# Altium footprint library PcbLibWatch.PcbLib: 17 footprints (part 1 of 2)
Each footprint in its own frame and in the unit in brackets; x right, y up, seen from the top. Pads: shape width x height; smd on the part's side, far side on the other; paste and mask are expansions set on the pad; w line width, h text height; cw(c..) or ccw(c..) is an arc to the next point about the centre after c.
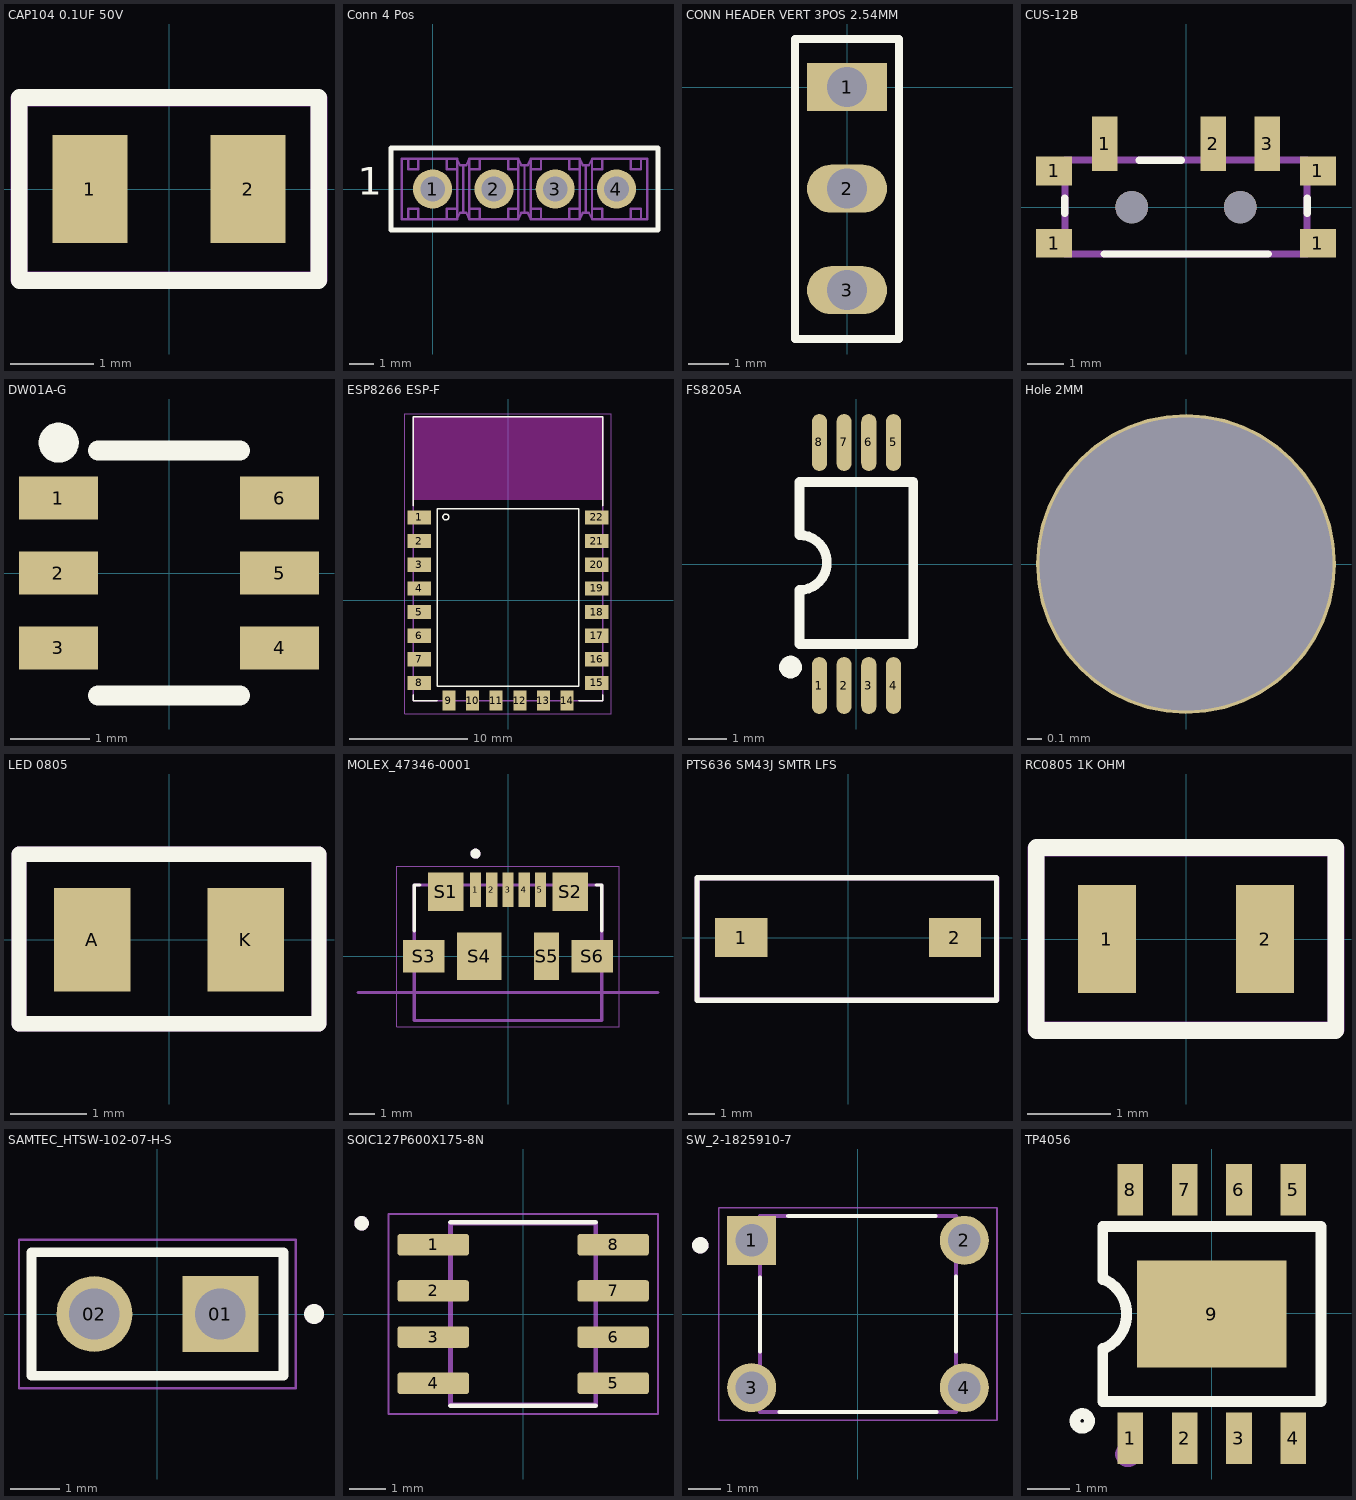
[diagram p0: the footprints below, top view; thin cyan lines are the x and y axes]

## CAP104 0.1UF 50V [mm] "0.1µF ±10% 50V Ceramic Capacitor X7R 0805 (2012 Metric)"
pads (2):
  rect 0.9x1.3 smd: 1(-0.95,0) 2(0.95,0)
Top Overlay:
  lines w0.2: -1.8,-1.1 1.8,-1.1 1.8,1.1 -1.8,1.1 -1.8,-1.1
Mechanical 29:
  lines w0.2: -1.803,-1.092 -1.803,1.092 1.803,1.092 1.803,-1.092 -1.803,-1.092
  text "'.Designator'" at -0.965,-0.813 h0.7
3D body "C0805C104K5RACTU.step": height 0.88, standoff 0, extent -1.1,-0.725 1.1,0.725

## Conn 4 Pos [mm]
pads (4):
  round 1.62 hole 1.02: 1(0,0) 2(2.54,0) 3(5.08,0) 4(7.62,0)
Top Overlay:
  lines w0.2: -1.72,-1.695 9.34,-1.695 9.34,1.695 -1.72,1.695 -1.72,-1.695
  text "1" at -3.09,-0.635 h1.97
Top Solder:
  circle w0: c7.62,0 r0.861
  circle w0: c5.08,0 r0.861
  circle w0: c2.54,0 r0.861
  circle w0: c0,0 r0.861
Bottom Solder:
  circle w0: c7.62,0 r0.861
  circle w0: c5.08,0 r0.861
  circle w0: c2.54,0 r0.861
  circle w0: c0,0 r0.861
Mechanical 16:
  lines w0.1: -1.016,-1.245 -1.016,-0.813 -0.587,-0.813 -0.587,-1.245 ; -1.016,1.245 -1.016,0.813 -0.587,0.813 -0.587,1.245 ; 0.587,-1.245 0.587,-0.813 1.016,-0.813 1.016,-1.245 ; 0.587,1.245 0.587,0.813 1.016,0.813 1.016,1.245 ; 1.953,-1.245 1.953,-0.813 1.524,-0.813 1.524,-1.245 ; 1.953,1.245 1.953,0.813 1.524,0.813 1.524,1.245 ; 3.127,-1.245 3.127,-0.813 3.556,-0.813 3.556,-1.245 ; 3.127,1.245 3.127,0.813 3.556,0.813 3.556,1.245 ; 4.493,-1.245 4.493,-0.813 4.064,-0.813 4.064,-1.245 ; 4.493,1.245 4.493,0.813 4.064,0.813 4.064,1.245 ; 5.667,-1.245 5.667,-0.813 6.096,-0.813 6.096,-1.245 ; 5.667,1.245 5.667,0.813 6.096,0.813 6.096,1.245 ; 7.033,-1.245 7.033,-0.813 6.604,-0.813 6.604,-1.245 ; 7.033,1.245 7.033,0.813 6.604,0.813 6.604,1.245 ; 8.207,-1.245 8.207,-0.813 8.636,-0.813 8.636,-1.245 ; 8.207,1.245 8.207,0.813 8.636,0.813 8.636,1.245 ; 1.016,-1.245 1.14,-0.991 1.27,-0.991 ; 1.016,-1.245 1.016,1.245 ; 1.016,-1.245 -1.27,-1.245 -1.27,1.245 1.016,1.245 ; 1.016,1.245 1.14,0.991 1.27,0.991 ; 1.27,-0.991 1.27,0.991 ; 1.27,-0.991 1.4,-0.991 1.524,-1.245 ; 1.27,-0.991 1.27,0.991 ; 1.27,0.991 1.4,0.991 1.524,1.245 ; 1.524,-1.245 1.524,1.245 ; 1.524,-1.245 3.556,-1.245 ; 1.524,1.245 3.556,1.245 ; 3.556,-1.245 3.556,1.245 ; 3.556,-1.245 3.68,-0.991 3.81,-0.991 ; 3.556,1.245 3.68,0.991 3.81,0.991 ; 3.81,-0.991 3.81,0.991 ; 3.81,-0.991 3.94,-0.991 4.064,-1.245 ; 3.81,-0.991 3.81,0.991 ; 3.81,0.991 3.94,0.991 4.064,1.245 ; 4.064,-1.245 4.064,1.245 ; 4.064,-1.245 6.096,-1.245 ; 4.064,1.245 6.096,1.245 ; 6.096,-1.245 6.096,1.245 ; 6.096,-1.245 6.22,-0.991 6.35,-0.991 ; 6.096,1.245 6.22,0.991 6.35,0.991 ; 6.35,-0.991 6.35,0.991 ; 6.35,-0.991 6.48,-0.991 6.604,-1.245 ; 6.35,-0.991 6.35,0.991 ; 6.35,0.991 6.48,0.991 6.604,1.245 ; 6.604,-1.245 6.604,1.245 ; 6.604,-1.245 8.89,-1.245 8.89,1.245 6.604,1.245 ; -0.318,-0.318 -0.318,0.318 0.318,0.318 0.318,-0.318 -0.318,-0.318 ; 2.222,-0.318 2.858,-0.318 2.858,0.318 2.222,0.318 2.222,-0.318 ; 4.762,-0.318 5.398,-0.318 5.398,0.318 4.762,0.318 4.762,-0.318 ; 7.302,-0.318 7.302,0.318 7.938,0.318 7.938,-0.318 7.302,-0.318
  text "1" at -3.09,-0.635 h1.97
Mechanical 42:
  lines w0.1: -1.72,-1.695 9.34,-1.695 9.34,1.695 -1.72,1.695 -1.72,-1.695
3D body "HTSW-104-07-T-S.stp": height 8.38, standoff -2.54, extent -1.143,-1.27 9.017,1.219

## CONN HEADER VERT 3POS 2.54MM [mm]
pads (3):
  rect 2x1.2 hole 1: 1(0,0)
  oval 2x1.2 hole 1: 2(0,-2.54) 3(0,-5.08)
Top Overlay:
  lines w0.2: -1.3,-6.3 -1.3,1.2 1.3,1.2 1.3,-6.3 -1.3,-6.3
3D body "c-87220-3-k-3d.stp": height 10.58, standoff -2.96, extent -1.168,-6.147 1.168,1.067

## CUS-12B [mm]
pads (9):
  rect 1x0.8 smd: 1(-3.65,-1) 1(-3.65,1) 1(3.65,-1) 1(3.65,1)
  rect 0.7x1.5 smd: 1(-2.25,1.75) 2(0.75,1.75) 3(2.25,1.75)
  round 0.9 hole 0.9 unplated: ""(-1.5,0) ""(1.5,0)
Top Overlay:
  lines w0.2: -3.353,-0.178 -3.353,0.254 ; -2.261,-1.295 2.286,-1.295 ; -1.295,1.295 -0.127,1.295 ; 3.353,-0.178 3.353,0.254
Mechanical 13:
  lines w0.2: -3.35,-1.3 3.35,-1.3 3.35,1.3 -3.35,1.3 -3.35,-1.3
3D body "CUS-12TB.stp": height 1.37, standoff -0.53, extent -3.85,-2.8 3.85,2.2

## DW01A-G [mm] "Bao ve pin lithium"
pads (6):
  rect 1x0.55 smd: 1(-1.4,0.95) 2(-1.4,0) 3(-1.4,-0.95) 4(1.4,-0.95) 5(1.4,0) 6(1.4,0.95)
Top Overlay:
  circle w0.254: c-1.397,1.651 r0.127
  lines w0.254: -0.9,-1.55 0.9,-1.55 ; -0.9,1.55 0.9,1.55
Mechanical 15:
  circle w0.2: c-1.4,0.95 r0.1
3D body "SOT-23-6.step": height 1.09, standoff 0, extent -1.213,-1.397 1.213,1.397

## ESP8266 ESP-F [mm] "ESP8266-12E/ESP-12E"
pads (22):
  rect 2x1.2 smd: 1(-7.5,7) 2(-7.5,5) 3(-7.5,3) 4(-7.5,1) 5(-7.5,-1) 6(-7.5,-3) 7(-7.5,-5) 8(-7.5,-7) 15(7.5,-7) 16(7.5,-5) 17(7.5,-3) 18(7.5,-1) 19(7.5,1) 20(7.5,3) 21(7.5,5) 22(7.5,7)
  rect 1.1x1.7 smd: 9(-5,-8.5) 10(-3,-8.5) 11(-1,-8.5) 12(1,-8.5) 13(3,-8.5) 14(5,-8.5)
Top Overlay:
  circle w0.127: c-5.258,7.036 r0.25
  lines w0.127: -8,-8 -8,-8.5 -6,-8.5 ; -8,8 -8,15.5 8,15.5 8,8 ; 6,-8.5 8,-8.5 8,-8 ; -6,-7.26 6,-7.26 6,7.74 -6,7.74 -6,-7.26
Keep-Out Layer:
  region: 8,8.51 -8.009,8.51 -8.009,15.5 8,15.5
  region: 8,8.51 -8.009,8.51 -8.009,15.5 8,15.5
Mechanical 13:
  lines w0.127: -8,-8.5 8,-8.5 8,15.5 -8,15.5 -8,-8.5
Mechanical 15:
  lines w0.05: -8.75,-9.625 8.75,-9.625 8.75,15.75 -8.75,15.75 -8.75,-9.625
3D body "ESP-12F.STEP": height 3.17, standoff 0, extent -8,-8.444 8,15.556

## FS8205A [mm]
pads (8):
  oval 0.4x1.5 smd: 1(-0.975,-3.2) 2(-0.325,-3.2) 3(0.325,-3.2) 4(0.975,-3.2) 5(0.975,3.2) 6(0.325,3.2) 7(-0.325,3.2) 8(-0.975,3.2)
Top Overlay:
  lines w0.254: -1.5,-0.711 -1.5,-2.108 1.5,-2.108 1.5,2.159 ; -1.5,-0.686 ccw(c-1.5,0.038) -1.5,0.762 -1.5,2.159 1.463,2.159
  lines w0.3: -1.737,-2.565 ccw(c-1.736,-2.715) -1.735,-2.565
3D body "TSSOP-8.STEP": height 1.2, standoff 0, extent -1.5,-3.175 1.5,3.225

## Hole 2MM [mm]
pads (1):
  round 2.05 hole 2: ""(0,0)

## LED 0805 [mm]
pads (2):
  rect 1x1.35 smd: A(-1,0) K(1,0)
Top Overlay:
  lines w0.2: -1.956,-1.092 1.956,-1.092 1.956,1.118 -1.956,1.118 -1.956,-1.092
Mechanical 29:
  lines w0.2: -1.956,-1.092 -1.956,1.118 1.956,1.118 1.956,-1.092 -1.956,-1.092
  text "'.Designator'" at -0.533,-0.559 h0.7
3D body "CHIPLED-0805.step": height 0.9, standoff -0.01, extent -1.05,-0.675 1.05,0.675

## MOLEX_47346-0001 [mm]
pads (11):
  rect 0.45x1.38 smd: 1(-1.3,2.66) 2(-0.65,2.66) 3(0,2.66) 4(0.65,2.66) 5(1.3,2.66)
  rect 1.425x1.55 smd: S1(-2.488,2.575) S2(2.488,2.575)
  rect 1.65x1.3 smd: S3(-3.375,0) S6(3.375,0)
  rect 1.8x1.9 smd: S4(-1.15,0)
  rect 1x1.9 smd: S5(1.55,0)
Top Overlay:
  circle w0.2: c-1.3,4.1 r0.1
  lines w0.127: -3.75,1 -3.75,2.85 -3.52,2.85 ; 3.52,2.85 3.75,2.85 3.75,1
Mechanical 13:
  circle w0.2: c-1.3,4.1 r0.1
  lines w0.127: -6,-1.45 6,-1.45 ; -3.75,-2.58 -3.75,2.85 3.75,2.85 3.75,-2.58 -3.75,-2.58
  text "PCB EDGE" at 4.5,-1.25 h0.41
Mechanical 15:
  lines w0.05: -4.45,-2.83 4.45,-2.83 4.45,3.6 -4.45,3.6 -4.45,-2.83
3D body "step_temp.STEP": height 2.7, standoff -0.25, extent -4.18,-2.93 4.18,2.5

## PTS636 SM43J SMTR LFS [mm]
pads (2):
  rect 2x1.5 smd: 1(-4.1,0) 2(4.1,0)
Top Overlay:
  lines w0.2: -5.8,-2.4 5.7,-2.4 5.7,2.3 -5.8,2.3 -5.8,-2.4
Mechanical 29:
  lines w0.2: -5.791,-2.388 5.715,-2.388 5.715,2.286 -5.791,2.286 -5.791,-2.388
  text "'.Designator'" at -1.956,-0.457 h0.7
3D body "PTS636 SM43J SMTR LFS--3DModel-STEP-56544.STEP": height 4.3, standoff 0, extent -3.55,-1.75 3.55,1.75

## RC0805 1K OHM [mm]
pads (2):
  rect 0.7x1.3 smd: 1(-0.95,0) 2(0.95,0)
Top Overlay:
  lines w0.2: -1.8,-1.1 -1.8,1.1 1.8,1.1 1.8,-1.1 -1.8,-1.1
Mechanical 29:
  lines w0.2: -1.803,-1.092 -1.803,1.092 1.803,1.092 1.803,-1.092 -1.803,-1.092
  text "'.Designator'" at -0.584,-0.457 h0.7
3D body "RC0805FR-0710KL.STEP": height 0.6, standoff 0, extent -1,-0.625 1,0.625

## SAMTEC_HTSW-102-07-H-S [mm]
pads (2):
  rect 1.53x1.53 hole 1.02: 01(1.27,0)
  round 1.53 hole 1.02: 02(-1.27,0)
Top Overlay:
  circle w0.2: c3.16,0 r0.1
  lines w0.2: -2.54,-1.245 2.54,-1.245 2.54,1.245 -2.54,1.245 -2.54,-1.245
Mechanical 13:
  circle w0.2: c3.16,0 r0.1
  lines w0.1: -2.54,-1.245 2.54,-1.245 2.54,1.245 -2.54,1.245 -2.54,-1.245
Mechanical 15:
  lines w0.05: -2.79,-1.495 2.79,-1.495 2.79,1.495 -2.79,1.495 -2.79,-1.495

## SOIC127P600X175-8N [mm]
pads (8):
  rrect25% 1.97x0.59 smd: 1(-2.475,1.905) 2(-2.475,0.635) 3(-2.475,-0.635) 4(-2.475,-1.905) 5(2.475,-1.905) 6(2.475,-0.635) 7(2.475,0.635) 8(2.475,1.905)
Top Overlay:
  circle w0.2: c-4.445,2.495 r0.1
  lines w0.127: -2,-2.52 2,-2.52 ; -2,2.52 2,2.52
Mechanical 13:
  circle w0.2: c-4.445,2.495 r0.1
  lines w0.127: -2,-2.5 2,-2.5 2,2.5 -2,2.5 -2,-2.5
Mechanical 15:
  lines w0.05: -3.71,-2.75 3.71,-2.75 3.71,2.75 -3.71,2.75 -3.71,-2.75
3D body "DS1307Z+.STEP": height 1.75, standoff 0, extent -3,-2.45 3,2.45

## SW_2-1825910-7 [mm]
pads (4):
  rect 1.498x1.498 hole 0.99: 1(-3.25,2.25)
  round 1.498 hole 0.99: 2(3.25,2.25) 3(-3.25,-2.25) 4(3.25,-2.25)
Top Overlay:
  circle w0.3: c-4.819,2.1 r0.1
  lines w0.127: -2.995,-1.15 -2.995,1.12 ; -2.4,-3 2.4,-3 ; -2.13,2.995 2.37,2.995 ; 2.995,-1.15 2.995,1.15
Mechanical 13:
  circle w0.3: c-4.819,2.1 r0.1
  lines w0.127: -2.995,-2.995 2.995,-2.995 2.995,2.995 -2.995,2.995 -2.995,-2.995
Mechanical 15:
  lines w0.05: -4.25,-3.25 4.25,-3.25 4.25,3.25 -4.25,3.25 -4.25,-3.25
3D body "TL1105BFxxxx.stp": height 9.71, standoff -3.34, extent -3.947,-3 3.947,3

## TP4056 [mm]
pads (9):
  rect 0.6x1.2 smd: 1(-1.905,-2.921) 2(-0.635,-2.921) 3(0.635,-2.921) 4(1.905,-2.921) 5(1.905,2.896) 6(0.635,2.896) 7(-0.635,2.896) 8(-1.905,2.896)
  rect 3.5x2.5 smd: 9(0,-0.013)
Top Overlay:
  circle w0.254: c-3.03,-2.513 r0.17
  lines w0.254: -2.55,-0.813 -2.55,-2.063 2.55,-2.063 2.55,2.037 -2.55,2.037 -2.55,0.787 ; -2.5,-0.813 ccw(c-2.875,-0.013) -2.5,0.787
Mechanical 15:
  circle w0.3: c-1.96,-3.293 r0.15
3D body "SOP-8.STEP": height 1.87, standoff 0, extent -2.5,-3.123 2.5,3.098